# Altium footprint library connectors_socets.pcblib: 567 footprints (part 14 of 36)
Each footprint in its own frame and in the unit in brackets; x right, y up, seen from the top. Pads: shape width x height; smd on the part's side, far side on the other; paste and mask are expansions set on the pad; w line width, h text height; cw(c..) or ccw(c..) is an arc to the next point about the centre after c.
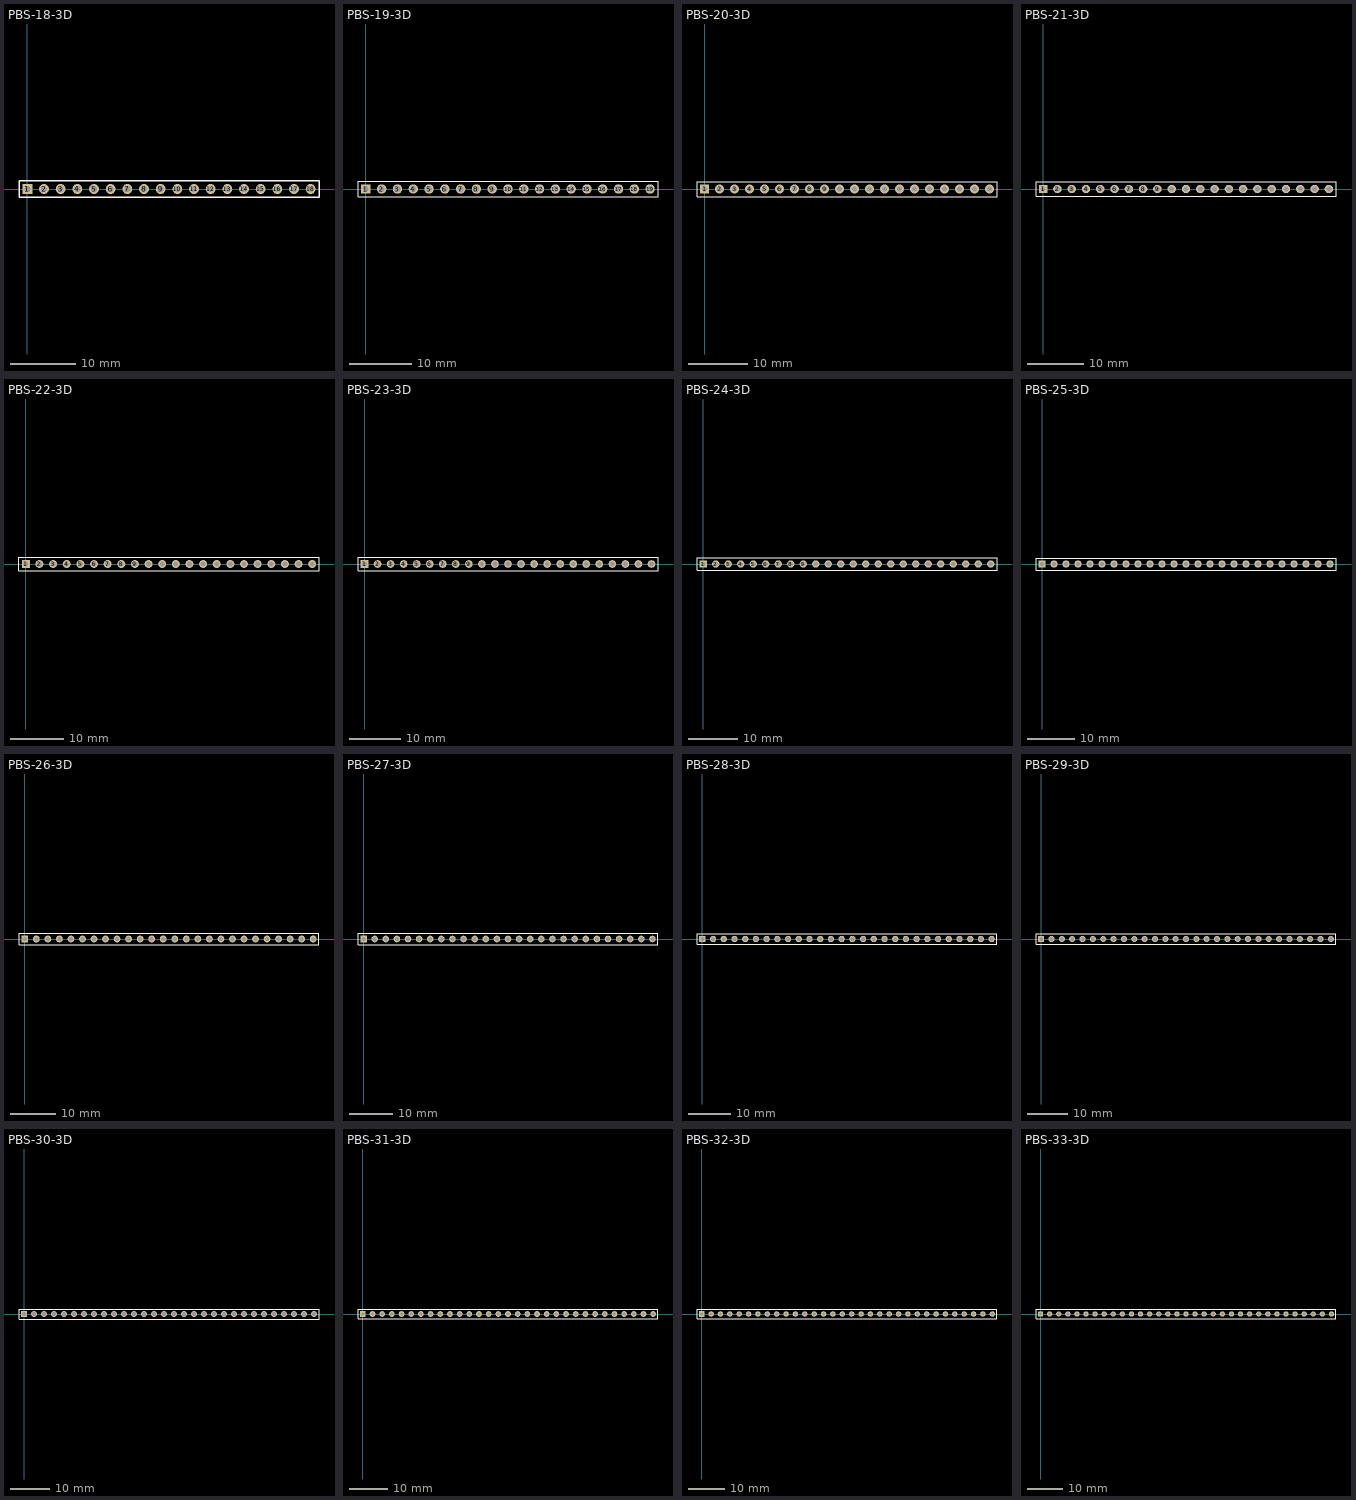
[diagram p13: the footprints below, top view; thin cyan lines are the x and y axes]

## PBS-18-3D [mm] "Connector; Header; 18 Position"
height 8
pads (18):
  rect 1.5x1.5 hole 0.9: 1(0,0)
  round 1.5 hole 0.9: 2(2.54,0) 3(5.08,0) 4(7.62,0) 5(10.16,0) 6(12.7,0) 7(15.24,0) 8(17.78,0) 9(20.32,0) 10(22.86,0) 11(25.4,0) 12(27.94,0) 13(30.48,0) 14(33.02,0) 15(35.56,0) 16(38.1,0) 17(40.64,0) 18(43.18,0)
Top Overlay:
  lines w0.2: -1.27,-1.27 44.45,-1.27 44.45,1.27 -1.27,1.27 -1.27,-1.27
3D body "PBD-2.stp": height 8.5, standoff -3.15, extent -1.27,-1.27 3.81,1.27
3D body "PBD-2.stp": height 8.5, standoff -3.15, extent 3.81,-1.27 8.89,1.27
3D body "PBD-2.stp": height 8.5, standoff -3.15, extent 8.89,-1.27 13.97,1.27
3D body "PBD-2.stp": height 8.5, standoff -3.15, extent 13.97,-1.27 19.05,1.27
3D body "PBD-2.stp": height 8.5, standoff -3.15, extent 19.05,-1.27 24.13,1.27
3D body "PBD-2.stp": height 8.5, standoff -3.15, extent 24.13,-1.27 29.21,1.27
3D body "PBD-2.stp": height 8.5, standoff -3.15, extent 29.21,-1.27 34.29,1.27
3D body "PBD-2.stp": height 8.5, standoff -3.15, extent 34.29,-1.27 39.37,1.27
3D body "PBD-2.stp": height 8.5, standoff -3.15, extent 39.37,-1.27 44.45,1.27

## PBS-19-3D [mm] "Connector; Header; 19 Position"
height 8
pads (19):
  rect 1.5x1.5 hole 0.9: 1(0,0)
  round 1.5 hole 0.9: 2(2.54,0) 3(5.08,0) 4(7.62,0) 5(10.16,0) 6(12.7,0) 7(15.24,0) 8(17.78,0) 9(20.32,0) 10(22.86,0) 11(25.4,0) 12(27.94,0) 13(30.48,0) 14(33.02,0) 15(35.56,0) 16(38.1,0) 17(40.64,0) 18(43.18,0) 19(45.72,0)
Top Overlay:
  lines w0.2: -1.27,-1.27 -1.27,1.27 46.99,1.27 46.99,-1.27 -1.27,-1.27
3D body "PBD-2.stp": height 8.5, standoff -3.15, extent 39.37,-1.27 44.45,1.27
3D body "PBD-2.stp": height 8.5, standoff -3.15, extent 34.29,-1.27 39.37,1.27
3D body "PBD-2.stp": height 8.5, standoff -3.15, extent 29.21,-1.27 34.29,1.27
3D body "PBD-2.stp": height 8.5, standoff -3.15, extent 24.13,-1.27 29.21,1.27
3D body "PBD-2.stp": height 8.5, standoff -3.15, extent 19.05,-1.27 24.13,1.27
3D body "PBD-2.stp": height 8.5, standoff -3.15, extent 13.97,-1.27 19.05,1.27
3D body "PBD-2.stp": height 8.5, standoff -3.15, extent 8.89,-1.27 13.97,1.27
3D body "PBD-2.stp": height 8.5, standoff -3.15, extent 3.81,-1.27 8.89,1.27
3D body "PBD-2.stp": height 8.5, standoff -3.15, extent -1.27,-1.27 3.81,1.27
3D body "PBS-1.stp": height 8.5, standoff -3.15, extent 44.45,-1.27 46.99,1.27

## PBS-20-3D [mm] "Connector; Header; 20 Position"
height 8
pads (20):
  rect 1.5x1.5 hole 0.9: 1(0,0)
  round 1.5 hole 0.9: 2(2.54,0) 3(5.08,0) 4(7.62,0) 5(10.16,0) 6(12.7,0) 7(15.24,0) 8(17.78,0) 9(20.32,0) 10(22.86,0) 11(25.4,0) 12(27.94,0) 13(30.48,0) 14(33.02,0) 15(35.56,0) 16(38.1,0) 17(40.64,0) 18(43.18,0) 19(45.72,0) 20(48.26,0)
Top Overlay:
  lines w0.2: -1.27,-1.27 49.53,-1.27 49.53,1.27 -1.27,1.27 -1.27,-1.27
3D body "PBD-2.stp": height 8.5, standoff -3.15, extent -1.27,-1.27 3.81,1.27
3D body "PBD-2.stp": height 8.5, standoff -3.15, extent 3.81,-1.27 8.89,1.27
3D body "PBD-2.stp": height 8.5, standoff -3.15, extent 8.89,-1.27 13.97,1.27
3D body "PBD-2.stp": height 8.5, standoff -3.15, extent 13.97,-1.27 19.05,1.27
3D body "PBD-2.stp": height 8.5, standoff -3.15, extent 19.05,-1.27 24.13,1.27
3D body "PBD-2.stp": height 8.5, standoff -3.15, extent 24.13,-1.27 29.21,1.27
3D body "PBD-2.stp": height 8.5, standoff -3.15, extent 29.21,-1.27 34.29,1.27
3D body "PBD-2.stp": height 8.5, standoff -3.15, extent 34.29,-1.27 39.37,1.27
3D body "PBD-2.stp": height 8.5, standoff -3.15, extent 39.37,-1.27 44.45,1.27
3D body "PBD-2.stp": height 8.5, standoff -3.15, extent 44.45,-1.27 49.53,1.27

## PBS-21-3D [mm] "Connector; Header; 21 Position"
height 8
pads (21):
  rect 1.5x1.5 hole 0.9: 1(0,0)
  round 1.5 hole 0.9: 2(2.54,0) 3(5.08,0) 4(7.62,0) 5(10.16,0) 6(12.7,0) 7(15.24,0) 8(17.78,0) 9(20.32,0) 10(22.86,0) 11(25.4,0) 12(27.94,0) 13(30.48,0) 14(33.02,0) 15(35.56,0) 16(38.1,0) 17(40.64,0) 18(43.18,0) 19(45.72,0) 20(48.26,0) 21(50.8,0)
Top Overlay:
  lines w0.2: -1.27,-1.27 -1.27,1.27 52.07,1.27 52.07,-1.27 -1.27,-1.27
3D body "PBD-2.stp": height 8.5, standoff -3.15, extent 44.45,-1.27 49.53,1.27
3D body "PBD-2.stp": height 8.5, standoff -3.15, extent 39.37,-1.27 44.45,1.27
3D body "PBD-2.stp": height 8.5, standoff -3.15, extent 34.29,-1.27 39.37,1.27
3D body "PBD-2.stp": height 8.5, standoff -3.15, extent 29.21,-1.27 34.29,1.27
3D body "PBD-2.stp": height 8.5, standoff -3.15, extent 24.13,-1.27 29.21,1.27
3D body "PBD-2.stp": height 8.5, standoff -3.15, extent 19.05,-1.27 24.13,1.27
3D body "PBD-2.stp": height 8.5, standoff -3.15, extent 13.97,-1.27 19.05,1.27
3D body "PBD-2.stp": height 8.5, standoff -3.15, extent 8.89,-1.27 13.97,1.27
3D body "PBD-2.stp": height 8.5, standoff -3.15, extent 3.81,-1.27 8.89,1.27
3D body "PBD-2.stp": height 8.5, standoff -3.15, extent -1.27,-1.27 3.81,1.27
3D body "PBS-1.stp": height 8.5, standoff -3.15, extent 49.53,-1.27 52.07,1.27

## PBS-22-3D [mm] "Connector; Header; 22 Position"
height 8
pads (22):
  rect 1.5x1.5 hole 0.9: 1(0,0)
  round 1.5 hole 0.9: 2(2.54,0) 3(5.08,0) 4(7.62,0) 5(10.16,0) 6(12.7,0) 7(15.24,0) 8(17.78,0) 9(20.32,0) 10(22.86,0) 11(25.4,0) 12(27.94,0) 13(30.48,0) 14(33.02,0) 15(35.56,0) 16(38.1,0) 17(40.64,0) 18(43.18,0) 19(45.72,0) 20(48.26,0) 21(50.8,0) 22(53.34,0)
Top Overlay:
  lines w0.2: -1.27,-1.27 54.61,-1.27 54.61,1.27 -1.27,1.27 -1.27,-1.27
3D body "PBD-2.stp": height 8.5, standoff -3.15, extent -1.27,-1.27 3.81,1.27
3D body "PBD-2.stp": height 8.5, standoff -3.15, extent 3.81,-1.27 8.89,1.27
3D body "PBD-2.stp": height 8.5, standoff -3.15, extent 8.89,-1.27 13.97,1.27
3D body "PBD-2.stp": height 8.5, standoff -3.15, extent 13.97,-1.27 19.05,1.27
3D body "PBD-2.stp": height 8.5, standoff -3.15, extent 19.05,-1.27 24.13,1.27
3D body "PBD-2.stp": height 8.5, standoff -3.15, extent 24.13,-1.27 29.21,1.27
3D body "PBD-2.stp": height 8.5, standoff -3.15, extent 29.21,-1.27 34.29,1.27
3D body "PBD-2.stp": height 8.5, standoff -3.15, extent 34.29,-1.27 39.37,1.27
3D body "PBD-2.stp": height 8.5, standoff -3.15, extent 39.37,-1.27 44.45,1.27
3D body "PBD-2.stp": height 8.5, standoff -3.15, extent 44.45,-1.27 49.53,1.27
3D body "PBD-2.stp": height 8.5, standoff -3.15, extent 49.53,-1.27 54.61,1.27

## PBS-23-3D [mm] "Connector; Header; 23 Position"
height 8
pads (23):
  rect 1.5x1.5 hole 0.9: 1(0,0)
  round 1.5 hole 0.9: 2(2.54,0) 3(5.08,0) 4(7.62,0) 5(10.16,0) 6(12.7,0) 7(15.24,0) 8(17.78,0) 9(20.32,0) 10(22.86,0) 11(25.4,0) 12(27.94,0) 13(30.48,0) 14(33.02,0) 15(35.56,0) 16(38.1,0) 17(40.64,0) 18(43.18,0) 19(45.72,0) 20(48.26,0) 21(50.8,0) 22(53.34,0) 23(55.88,0)
Top Overlay:
  lines w0.2: -1.27,-1.27 -1.27,1.27 57.15,1.27 57.15,-1.27 -1.27,-1.27
3D body "PBD-2.stp": height 8.5, standoff -3.15, extent 49.53,-1.27 54.61,1.27
3D body "PBD-2.stp": height 8.5, standoff -3.15, extent 44.45,-1.27 49.53,1.27
3D body "PBD-2.stp": height 8.5, standoff -3.15, extent 39.37,-1.27 44.45,1.27
3D body "PBD-2.stp": height 8.5, standoff -3.15, extent 34.29,-1.27 39.37,1.27
3D body "PBD-2.stp": height 8.5, standoff -3.15, extent 29.21,-1.27 34.29,1.27
3D body "PBD-2.stp": height 8.5, standoff -3.15, extent 24.13,-1.27 29.21,1.27
3D body "PBD-2.stp": height 8.5, standoff -3.15, extent 19.05,-1.27 24.13,1.27
3D body "PBD-2.stp": height 8.5, standoff -3.15, extent 13.97,-1.27 19.05,1.27
3D body "PBD-2.stp": height 8.5, standoff -3.15, extent 8.89,-1.27 13.97,1.27
3D body "PBD-2.stp": height 8.5, standoff -3.15, extent 3.81,-1.27 8.89,1.27
3D body "PBD-2.stp": height 8.5, standoff -3.15, extent -1.27,-1.27 3.81,1.27
3D body "PBS-1.stp": height 8.5, standoff -3.15, extent 54.61,-1.27 57.15,1.27

## PBS-24-3D [mm] "Connector; Header; 24 Position"
height 8
pads (24):
  rect 1.5x1.5 hole 0.9: 1(0,0)
  round 1.5 hole 0.9: 2(2.54,0) 3(5.08,0) 4(7.62,0) 5(10.16,0) 6(12.7,0) 7(15.24,0) 8(17.78,0) 9(20.32,0) 10(22.86,0) 11(25.4,0) 12(27.94,0) 13(30.48,0) 14(33.02,0) 15(35.56,0) 16(38.1,0) 17(40.64,0) 18(43.18,0) 19(45.72,0) 20(48.26,0) 21(50.8,0) 22(53.34,0) 23(55.88,0) 24(58.42,0)
Top Overlay:
  lines w0.2: -1.27,-1.27 59.69,-1.27 59.69,1.27 -1.27,1.27 -1.27,-1.27
3D body "PBD-2.stp": height 8.5, standoff -3.15, extent -1.27,-1.27 3.81,1.27
3D body "PBD-2.stp": height 8.5, standoff -3.15, extent 3.81,-1.27 8.89,1.27
3D body "PBD-2.stp": height 8.5, standoff -3.15, extent 8.89,-1.27 13.97,1.27
3D body "PBD-2.stp": height 8.5, standoff -3.15, extent 13.97,-1.27 19.05,1.27
3D body "PBD-2.stp": height 8.5, standoff -3.15, extent 19.05,-1.27 24.13,1.27
3D body "PBD-2.stp": height 8.5, standoff -3.15, extent 24.13,-1.27 29.21,1.27
3D body "PBD-2.stp": height 8.5, standoff -3.15, extent 29.21,-1.27 34.29,1.27
3D body "PBD-2.stp": height 8.5, standoff -3.15, extent 34.29,-1.27 39.37,1.27
3D body "PBD-2.stp": height 8.5, standoff -3.15, extent 39.37,-1.27 44.45,1.27
3D body "PBD-2.stp": height 8.5, standoff -3.15, extent 44.45,-1.27 49.53,1.27
3D body "PBD-2.stp": height 8.5, standoff -3.15, extent 49.53,-1.27 54.61,1.27
3D body "PBD-2.stp": height 8.5, standoff -3.15, extent 54.61,-1.27 59.69,1.27

## PBS-25-3D [mm] "Connector; Header; 25 Position"
height 8
pads (25):
  rect 1.5x1.5 hole 0.9: 1(0,0)
  round 1.5 hole 0.9: 2(2.54,0) 3(5.08,0) 4(7.62,0) 5(10.16,0) 6(12.7,0) 7(15.24,0) 8(17.78,0) 9(20.32,0) 10(22.86,0) 11(25.4,0) 12(27.94,0) 13(30.48,0) 14(33.02,0) 15(35.56,0) 16(38.1,0) 17(40.64,0) 18(43.18,0) 19(45.72,0) 20(48.26,0) 21(50.8,0) 22(53.34,0) 23(55.88,0) 24(58.42,0) 25(60.96,0)
Top Overlay:
  lines w0.2: -1.27,-1.27 -1.27,1.27 62.23,1.27 62.23,-1.27 -1.27,-1.27
3D body "PBS-1.stp": height 8.5, standoff -3.15, extent 59.69,-1.27 62.23,1.27
3D body "PBD-2.stp": height 8.5, standoff -3.15, extent -1.27,-1.27 3.81,1.27
3D body "PBD-2.stp": height 8.5, standoff -3.15, extent 3.81,-1.27 8.89,1.27
3D body "PBD-2.stp": height 8.5, standoff -3.15, extent 8.89,-1.27 13.97,1.27
3D body "PBD-2.stp": height 8.5, standoff -3.15, extent 13.97,-1.27 19.05,1.27
3D body "PBD-2.stp": height 8.5, standoff -3.15, extent 19.05,-1.27 24.13,1.27
3D body "PBD-2.stp": height 8.5, standoff -3.15, extent 24.13,-1.27 29.21,1.27
3D body "PBD-2.stp": height 8.5, standoff -3.15, extent 29.21,-1.27 34.29,1.27
3D body "PBD-2.stp": height 8.5, standoff -3.15, extent 34.29,-1.27 39.37,1.27
3D body "PBD-2.stp": height 8.5, standoff -3.15, extent 39.37,-1.27 44.45,1.27
3D body "PBD-2.stp": height 8.5, standoff -3.15, extent 44.45,-1.27 49.53,1.27
3D body "PBD-2.stp": height 8.5, standoff -3.15, extent 49.53,-1.27 54.61,1.27
3D body "PBD-2.stp": height 8.5, standoff -3.15, extent 54.61,-1.27 59.69,1.27

## PBS-26-3D [mm] "Connector; Header; 26 Position"
height 8
pads (26):
  rect 1.5x1.5 hole 0.9: 1(0,0)
  round 1.5 hole 0.9: 2(2.54,0) 3(5.08,0) 4(7.62,0) 5(10.16,0) 6(12.7,0) 7(15.24,0) 8(17.78,0) 9(20.32,0) 10(22.86,0) 11(25.4,0) 12(27.94,0) 13(30.48,0) 14(33.02,0) 15(35.56,0) 16(38.1,0) 17(40.64,0) 18(43.18,0) 19(45.72,0) 20(48.26,0) 21(50.8,0) 22(53.34,0) 23(55.88,0) 24(58.42,0) 25(60.96,0) 26(63.5,0)
Top Overlay:
  lines w0.2: -1.27,-1.27 64.77,-1.27 64.77,1.27 -1.27,1.27 -1.27,-1.27
3D body "PBD-2.stp": height 8.5, standoff -3.15, extent -1.27,-1.27 3.81,1.27
3D body "PBD-2.stp": height 8.5, standoff -3.15, extent 3.81,-1.27 8.89,1.27
3D body "PBD-2.stp": height 8.5, standoff -3.15, extent 8.89,-1.27 13.97,1.27
3D body "PBD-2.stp": height 8.5, standoff -3.15, extent 13.97,-1.27 19.05,1.27
3D body "PBD-2.stp": height 8.5, standoff -3.15, extent 19.05,-1.27 24.13,1.27
3D body "PBD-2.stp": height 8.5, standoff -3.15, extent 24.13,-1.27 29.21,1.27
3D body "PBD-2.stp": height 8.5, standoff -3.15, extent 29.21,-1.27 34.29,1.27
3D body "PBD-2.stp": height 8.5, standoff -3.15, extent 34.29,-1.27 39.37,1.27
3D body "PBD-2.stp": height 8.5, standoff -3.15, extent 39.37,-1.27 44.45,1.27
3D body "PBD-2.stp": height 8.5, standoff -3.15, extent 44.45,-1.27 49.53,1.27
3D body "PBD-2.stp": height 8.5, standoff -3.15, extent 49.53,-1.27 54.61,1.27
3D body "PBD-2.stp": height 8.5, standoff -3.15, extent 54.61,-1.27 59.69,1.27
3D body "PBD-2.stp": height 8.5, standoff -3.15, extent 59.69,-1.27 64.77,1.27

## PBS-27-3D [mm] "Connector; Header; 27 Position"
height 8
pads (27):
  rect 1.5x1.5 hole 0.9: 1(0,0)
  round 1.5 hole 0.9: 2(2.54,0) 3(5.08,0) 4(7.62,0) 5(10.16,0) 6(12.7,0) 7(15.24,0) 8(17.78,0) 9(20.32,0) 10(22.86,0) 11(25.4,0) 12(27.94,0) 13(30.48,0) 14(33.02,0) 15(35.56,0) 16(38.1,0) 17(40.64,0) 18(43.18,0) 19(45.72,0) 20(48.26,0) 21(50.8,0) 22(53.34,0) 23(55.88,0) 24(58.42,0) 25(60.96,0) 26(63.5,0) 27(66.04,0)
Top Overlay:
  lines w0.2: -1.27,-1.27 67.31,-1.27 67.31,1.27 -1.27,1.27 -1.27,-1.27
3D body "PBS-1.stp": height 8.5, standoff -3.15, extent 64.77,-1.27 67.31,1.27
3D body "PBD-2.stp": height 8.5, standoff -3.15, extent 59.69,-1.27 64.77,1.27
3D body "PBD-2.stp": height 8.5, standoff -3.15, extent 54.61,-1.27 59.69,1.27
3D body "PBD-2.stp": height 8.5, standoff -3.15, extent 49.53,-1.27 54.61,1.27
3D body "PBD-2.stp": height 8.5, standoff -3.15, extent 44.45,-1.27 49.53,1.27
3D body "PBD-2.stp": height 8.5, standoff -3.15, extent 39.37,-1.27 44.45,1.27
3D body "PBD-2.stp": height 8.5, standoff -3.15, extent 34.29,-1.27 39.37,1.27
3D body "PBD-2.stp": height 8.5, standoff -3.15, extent 29.21,-1.27 34.29,1.27
3D body "PBD-2.stp": height 8.5, standoff -3.15, extent 24.13,-1.27 29.21,1.27
3D body "PBD-2.stp": height 8.5, standoff -3.15, extent 19.05,-1.27 24.13,1.27
3D body "PBD-2.stp": height 8.5, standoff -3.15, extent 13.97,-1.27 19.05,1.27
3D body "PBD-2.stp": height 8.5, standoff -3.15, extent 8.89,-1.27 13.97,1.27
3D body "PBD-2.stp": height 8.5, standoff -3.15, extent 3.81,-1.27 8.89,1.27
3D body "PBD-2.stp": height 8.5, standoff -3.15, extent -1.27,-1.27 3.81,1.27

## PBS-28-3D [mm] "Connector; Header; 28 Position"
height 8
pads (28):
  rect 1.5x1.5 hole 0.9: 1(0,0)
  round 1.5 hole 0.9: 2(2.54,0) 3(5.08,0) 4(7.62,0) 5(10.16,0) 6(12.7,0) 7(15.24,0) 8(17.78,0) 9(20.32,0) 10(22.86,0) 11(25.4,0) 12(27.94,0) 13(30.48,0) 14(33.02,0) 15(35.56,0) 16(38.1,0) 17(40.64,0) 18(43.18,0) 19(45.72,0) 20(48.26,0) 21(50.8,0) 22(53.34,0) 23(55.88,0) 24(58.42,0) 25(60.96,0) 26(63.5,0) 27(66.04,0) 28(68.58,0)
Top Overlay:
  lines w0.2: -1.27,-1.27 -1.27,1.27 69.85,1.27 69.85,-1.27 -1.27,-1.27
3D body "PBD-2.stp": height 8.5, standoff -3.15, extent 64.77,-1.27 69.85,1.27
3D body "PBD-2.stp": height 8.5, standoff -3.15, extent 59.69,-1.27 64.77,1.27
3D body "PBD-2.stp": height 8.5, standoff -3.15, extent 54.61,-1.27 59.69,1.27
3D body "PBD-2.stp": height 8.5, standoff -3.15, extent 49.53,-1.27 54.61,1.27
3D body "PBD-2.stp": height 8.5, standoff -3.15, extent 44.45,-1.27 49.53,1.27
3D body "PBD-2.stp": height 8.5, standoff -3.15, extent 39.37,-1.27 44.45,1.27
3D body "PBD-2.stp": height 8.5, standoff -3.15, extent 34.29,-1.27 39.37,1.27
3D body "PBD-2.stp": height 8.5, standoff -3.15, extent 29.21,-1.27 34.29,1.27
3D body "PBD-2.stp": height 8.5, standoff -3.15, extent 24.13,-1.27 29.21,1.27
3D body "PBD-2.stp": height 8.5, standoff -3.15, extent 19.05,-1.27 24.13,1.27
3D body "PBD-2.stp": height 8.5, standoff -3.15, extent 13.97,-1.27 19.05,1.27
3D body "PBD-2.stp": height 8.5, standoff -3.15, extent 8.89,-1.27 13.97,1.27
3D body "PBD-2.stp": height 8.5, standoff -3.15, extent 3.81,-1.27 8.89,1.27
3D body "PBD-2.stp": height 8.5, standoff -3.15, extent -1.27,-1.27 3.81,1.27

## PBS-29-3D [mm] "Connector; Header; 29 Position"
height 8
pads (29):
  rect 1.5x1.5 hole 0.9: 1(0,0)
  round 1.5 hole 0.9: 2(2.54,0) 3(5.08,0) 4(7.62,0) 5(10.16,0) 6(12.7,0) 7(15.24,0) 8(17.78,0) 9(20.32,0) 10(22.86,0) 11(25.4,0) 12(27.94,0) 13(30.48,0) 14(33.02,0) 15(35.56,0) 16(38.1,0) 17(40.64,0) 18(43.18,0) 19(45.72,0) 20(48.26,0) 21(50.8,0) 22(53.34,0) 23(55.88,0) 24(58.42,0) 25(60.96,0) 26(63.5,0) 27(66.04,0) 28(68.58,0) 29(71.12,0)
Top Overlay:
  lines w0.2: -1.27,-1.27 72.39,-1.27 72.39,1.27 -1.27,1.27 -1.27,-1.27
3D body "PBS-1.stp": height 8.5, standoff -3.15, extent 69.85,-1.27 72.39,1.27
3D body "PBD-2.stp": height 8.5, standoff -3.15, extent -1.27,-1.27 3.81,1.27
3D body "PBD-2.stp": height 8.5, standoff -3.15, extent 3.81,-1.27 8.89,1.27
3D body "PBD-2.stp": height 8.5, standoff -3.15, extent 8.89,-1.27 13.97,1.27
3D body "PBD-2.stp": height 8.5, standoff -3.15, extent 13.97,-1.27 19.05,1.27
3D body "PBD-2.stp": height 8.5, standoff -3.15, extent 19.05,-1.27 24.13,1.27
3D body "PBD-2.stp": height 8.5, standoff -3.15, extent 24.13,-1.27 29.21,1.27
3D body "PBD-2.stp": height 8.5, standoff -3.15, extent 29.21,-1.27 34.29,1.27
3D body "PBD-2.stp": height 8.5, standoff -3.15, extent 34.29,-1.27 39.37,1.27
3D body "PBD-2.stp": height 8.5, standoff -3.15, extent 39.37,-1.27 44.45,1.27
3D body "PBD-2.stp": height 8.5, standoff -3.15, extent 44.45,-1.27 49.53,1.27
3D body "PBD-2.stp": height 8.5, standoff -3.15, extent 49.53,-1.27 54.61,1.27
3D body "PBD-2.stp": height 8.5, standoff -3.15, extent 54.61,-1.27 59.69,1.27
3D body "PBD-2.stp": height 8.5, standoff -3.15, extent 59.69,-1.27 64.77,1.27
3D body "PBD-2.stp": height 8.5, standoff -3.15, extent 64.77,-1.27 69.85,1.27

## PBS-30-3D [mm] "Connector; Header; 30 Position"
height 8
pads (30):
  rect 1.5x1.5 hole 0.9: 1(0,0)
  round 1.5 hole 0.9: 2(2.54,0) 3(5.08,0) 4(7.62,0) 5(10.16,0) 6(12.7,0) 7(15.24,0) 8(17.78,0) 9(20.32,0) 10(22.86,0) 11(25.4,0) 12(27.94,0) 13(30.48,0) 14(33.02,0) 15(35.56,0) 16(38.1,0) 17(40.64,0) 18(43.18,0) 19(45.72,0) 20(48.26,0) 21(50.8,0) 22(53.34,0) 23(55.88,0) 24(58.42,0) 25(60.96,0) 26(63.5,0) 27(66.04,0) 28(68.58,0) 29(71.12,0) 30(73.66,0)
Top Overlay:
  lines w0.2: -1.27,-1.27 -1.27,1.27 74.93,1.27 74.93,-1.27 -1.27,-1.27
3D body "PBD-2.stp": height 8.5, standoff -3.15, extent 69.85,-1.27 74.93,1.27
3D body "PBD-2.stp": height 8.5, standoff -3.15, extent 64.77,-1.27 69.85,1.27
3D body "PBD-2.stp": height 8.5, standoff -3.15, extent 59.69,-1.27 64.77,1.27
3D body "PBD-2.stp": height 8.5, standoff -3.15, extent 54.61,-1.27 59.69,1.27
3D body "PBD-2.stp": height 8.5, standoff -3.15, extent 49.53,-1.27 54.61,1.27
3D body "PBD-2.stp": height 8.5, standoff -3.15, extent 44.45,-1.27 49.53,1.27
3D body "PBD-2.stp": height 8.5, standoff -3.15, extent 39.37,-1.27 44.45,1.27
3D body "PBD-2.stp": height 8.5, standoff -3.15, extent 34.29,-1.27 39.37,1.27
3D body "PBD-2.stp": height 8.5, standoff -3.15, extent 29.21,-1.27 34.29,1.27
3D body "PBD-2.stp": height 8.5, standoff -3.15, extent 24.13,-1.27 29.21,1.27
3D body "PBD-2.stp": height 8.5, standoff -3.15, extent 19.05,-1.27 24.13,1.27
3D body "PBD-2.stp": height 8.5, standoff -3.15, extent 13.97,-1.27 19.05,1.27
3D body "PBD-2.stp": height 8.5, standoff -3.15, extent 8.89,-1.27 13.97,1.27
3D body "PBD-2.stp": height 8.5, standoff -3.15, extent 3.81,-1.27 8.89,1.27
3D body "PBD-2.stp": height 8.5, standoff -3.15, extent -1.27,-1.27 3.81,1.27

## PBS-31-3D [mm] "Connector; Header; 31 Position"
height 8
pads (31):
  rect 1.5x1.5 hole 0.9: 1(0,0)
  round 1.5 hole 0.9: 2(2.54,0) 3(5.08,0) 4(7.62,0) 5(10.16,0) 6(12.7,0) 7(15.24,0) 8(17.78,0) 9(20.32,0) 10(22.86,0) 11(25.4,0) 12(27.94,0) 13(30.48,0) 14(33.02,0) 15(35.56,0) 16(38.1,0) 17(40.64,0) 18(43.18,0) 19(45.72,0) 20(48.26,0) 21(50.8,0) 22(53.34,0) 23(55.88,0) 24(58.42,0) 25(60.96,0) 26(63.5,0) 27(66.04,0) 28(68.58,0) 29(71.12,0) 30(73.66,0) 31(76.2,0)
Top Overlay:
  lines w0.2: -1.27,-1.27 77.47,-1.27 77.47,1.27 -1.27,1.27 -1.27,-1.27
3D body "PBS-1.stp": height 8.5, standoff -3.15, extent 74.93,-1.27 77.47,1.27
3D body "PBD-2.stp": height 8.5, standoff -3.15, extent -1.27,-1.27 3.81,1.27
3D body "PBD-2.stp": height 8.5, standoff -3.15, extent 3.81,-1.27 8.89,1.27
3D body "PBD-2.stp": height 8.5, standoff -3.15, extent 8.89,-1.27 13.97,1.27
3D body "PBD-2.stp": height 8.5, standoff -3.15, extent 13.97,-1.27 19.05,1.27
3D body "PBD-2.stp": height 8.5, standoff -3.15, extent 19.05,-1.27 24.13,1.27
3D body "PBD-2.stp": height 8.5, standoff -3.15, extent 24.13,-1.27 29.21,1.27
3D body "PBD-2.stp": height 8.5, standoff -3.15, extent 29.21,-1.27 34.29,1.27
3D body "PBD-2.stp": height 8.5, standoff -3.15, extent 34.29,-1.27 39.37,1.27
3D body "PBD-2.stp": height 8.5, standoff -3.15, extent 39.37,-1.27 44.45,1.27
3D body "PBD-2.stp": height 8.5, standoff -3.15, extent 44.45,-1.27 49.53,1.27
3D body "PBD-2.stp": height 8.5, standoff -3.15, extent 49.53,-1.27 54.61,1.27
3D body "PBD-2.stp": height 8.5, standoff -3.15, extent 54.61,-1.27 59.69,1.27
3D body "PBD-2.stp": height 8.5, standoff -3.15, extent 59.69,-1.27 64.77,1.27
3D body "PBD-2.stp": height 8.5, standoff -3.15, extent 64.77,-1.27 69.85,1.27
3D body "PBD-2.stp": height 8.5, standoff -3.15, extent 69.85,-1.27 74.93,1.27

## PBS-32-3D [mm] "Connector; Header; 32 Position"
height 8
pads (32):
  rect 1.5x1.5 hole 0.9: 1(0,0)
  round 1.5 hole 0.9: 2(2.54,0) 3(5.08,0) 4(7.62,0) 5(10.16,0) 6(12.7,0) 7(15.24,0) 8(17.78,0) 9(20.32,0) 10(22.86,0) 11(25.4,0) 12(27.94,0) 13(30.48,0) 14(33.02,0) 15(35.56,0) 16(38.1,0) 17(40.64,0) 18(43.18,0) 19(45.72,0) 20(48.26,0) 21(50.8,0) 22(53.34,0) 23(55.88,0) 24(58.42,0) 25(60.96,0) 26(63.5,0) 27(66.04,0) 28(68.58,0) 29(71.12,0) 30(73.66,0) 31(76.2,0) 32(78.74,0)
Top Overlay:
  lines w0.2: -1.27,-1.27 -1.27,1.27 80.01,1.27 80.01,-1.27 -1.27,-1.27
3D body "PBD-2.stp": height 8.5, standoff -3.15, extent 74.93,-1.27 80.01,1.27
3D body "PBD-2.stp": height 8.5, standoff -3.15, extent 69.85,-1.27 74.93,1.27
3D body "PBD-2.stp": height 8.5, standoff -3.15, extent 64.77,-1.27 69.85,1.27
3D body "PBD-2.stp": height 8.5, standoff -3.15, extent 59.69,-1.27 64.77,1.27
3D body "PBD-2.stp": height 8.5, standoff -3.15, extent 54.61,-1.27 59.69,1.27
3D body "PBD-2.stp": height 8.5, standoff -3.15, extent 49.53,-1.27 54.61,1.27
3D body "PBD-2.stp": height 8.5, standoff -3.15, extent 44.45,-1.27 49.53,1.27
3D body "PBD-2.stp": height 8.5, standoff -3.15, extent 39.37,-1.27 44.45,1.27
3D body "PBD-2.stp": height 8.5, standoff -3.15, extent 34.29,-1.27 39.37,1.27
3D body "PBD-2.stp": height 8.5, standoff -3.15, extent 29.21,-1.27 34.29,1.27
3D body "PBD-2.stp": height 8.5, standoff -3.15, extent 24.13,-1.27 29.21,1.27
3D body "PBD-2.stp": height 8.5, standoff -3.15, extent 19.05,-1.27 24.13,1.27
3D body "PBD-2.stp": height 8.5, standoff -3.15, extent 13.97,-1.27 19.05,1.27
3D body "PBD-2.stp": height 8.5, standoff -3.15, extent 8.89,-1.27 13.97,1.27
3D body "PBD-2.stp": height 8.5, standoff -3.15, extent 3.81,-1.27 8.89,1.27
3D body "PBD-2.stp": height 8.5, standoff -3.15, extent -1.27,-1.27 3.81,1.27

## PBS-33-3D [mm] "Connector; Header; 33 Position"
height 8
pads (33):
  rect 1.5x1.5 hole 0.9: 1(0,0)
  round 1.5 hole 0.9: 2(2.54,0) 3(5.08,0) 4(7.62,0) 5(10.16,0) 6(12.7,0) 7(15.24,0) 8(17.78,0) 9(20.32,0) 10(22.86,0) 11(25.4,0) 12(27.94,0) 13(30.48,0) 14(33.02,0) 15(35.56,0) 16(38.1,0) 17(40.64,0) 18(43.18,0) 19(45.72,0) 20(48.26,0) 21(50.8,0) 22(53.34,0) 23(55.88,0) 24(58.42,0) 25(60.96,0) 26(63.5,0) 27(66.04,0) 28(68.58,0) 29(71.12,0) 30(73.66,0) 31(76.2,0) 32(78.74,0) 33(81.28,0)
Top Overlay:
  lines w0.2: -1.27,-1.27 -1.27,1.27 82.55,1.27 82.55,-1.27 -1.27,-1.27
3D body "PBS-1.stp": height 8.5, standoff -3.15, extent 80.01,-1.27 82.55,1.27
3D body "PBD-2.stp": height 8.5, standoff -3.15, extent -1.27,-1.27 3.81,1.27
3D body "PBD-2.stp": height 8.5, standoff -3.15, extent 3.81,-1.27 8.89,1.27
3D body "PBD-2.stp": height 8.5, standoff -3.15, extent 8.89,-1.27 13.97,1.27
3D body "PBD-2.stp": height 8.5, standoff -3.15, extent 13.97,-1.27 19.05,1.27
3D body "PBD-2.stp": height 8.5, standoff -3.15, extent 19.05,-1.27 24.13,1.27
3D body "PBD-2.stp": height 8.5, standoff -3.15, extent 24.13,-1.27 29.21,1.27
3D body "PBD-2.stp": height 8.5, standoff -3.15, extent 29.21,-1.27 34.29,1.27
3D body "PBD-2.stp": height 8.5, standoff -3.15, extent 34.29,-1.27 39.37,1.27
3D body "PBD-2.stp": height 8.5, standoff -3.15, extent 39.37,-1.27 44.45,1.27
3D body "PBD-2.stp": height 8.5, standoff -3.15, extent 44.45,-1.27 49.53,1.27
3D body "PBD-2.stp": height 8.5, standoff -3.15, extent 49.53,-1.27 54.61,1.27
3D body "PBD-2.stp": height 8.5, standoff -3.15, extent 54.61,-1.27 59.69,1.27
3D body "PBD-2.stp": height 8.5, standoff -3.15, extent 59.69,-1.27 64.77,1.27
3D body "PBD-2.stp": height 8.5, standoff -3.15, extent 64.77,-1.27 69.85,1.27
3D body "PBD-2.stp": height 8.5, standoff -3.15, extent 69.85,-1.27 74.93,1.27
3D body "PBD-2.stp": height 8.5, standoff -3.15, extent 74.93,-1.27 80.01,1.27